# Altium footprint library PCB1.PcbLib: 98 footprints (part 3 of 7)
Each footprint in its own frame and in the unit in brackets; x right, y up, seen from the top. Pads: shape width x height; smd on the part's side, far side on the other; paste and mask are expansions set on the pad; w line width, h text height; cw(c..) or ccw(c..) is an arc to the next point about the centre after c.
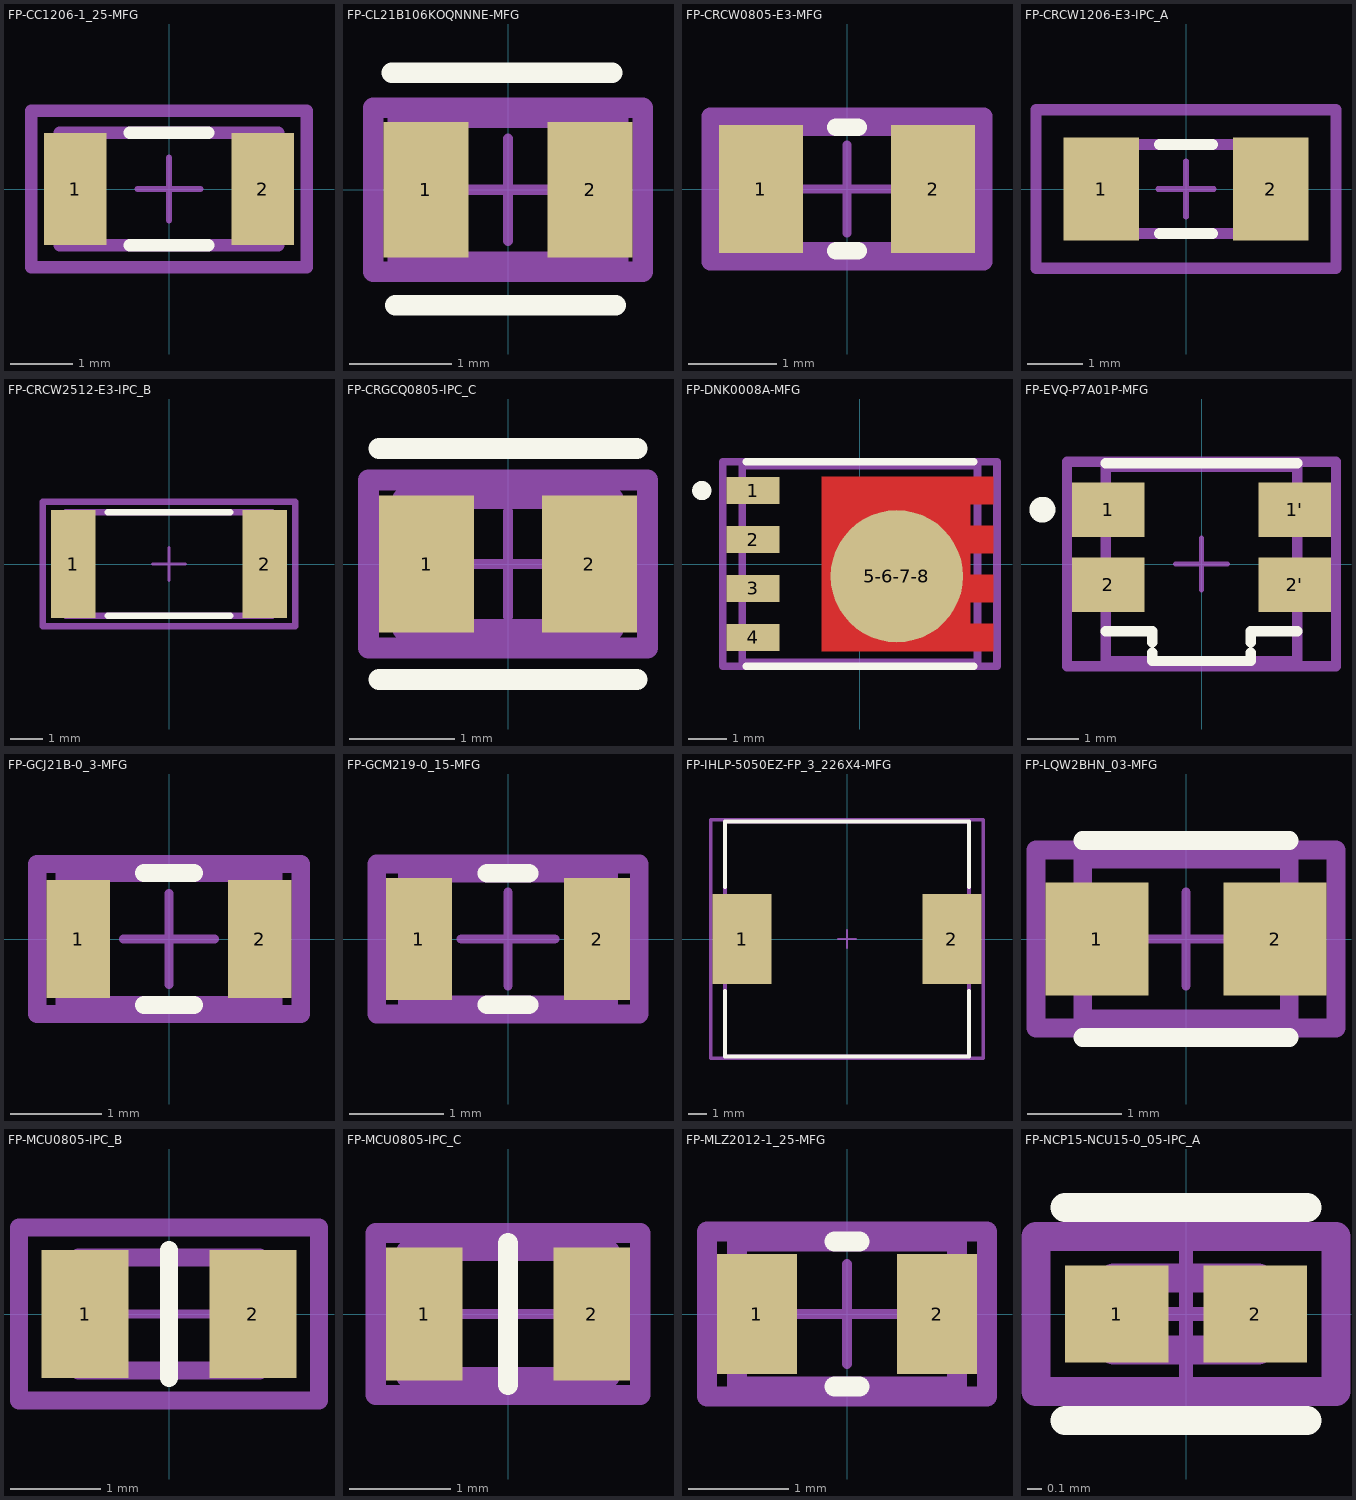
[diagram p2: the footprints below, top view; thin cyan lines are the x and y axes]

## FP-CC1206-1_25-MFG [mm]
pads (2):
  rect 1x1.8 smd paste+0 mask+0: 1(-1.5,0) 2(1.5,0)
Top Overlay:
  lines w0.2: -0.625,-0.9 0.625,-0.9 ; -0.625,0.9 0.625,0.9
Top Assembly:
  lines w0.2: -2.2,-1.25 -2.2,1.25 2.2,1.25 2.2,-1.25 -2.2,-1.25
Top 3D Body:
  lines w0.2: -1.75,-0.9 -1.75,0.9 1.75,0.9 1.75,-0.9 -1.75,-0.9
Top Courtyard:
  lines w0.2: -2.2,-1.25 -2.2,1.25 2.2,1.25 2.2,-1.25 -2.2,-1.25
Top Component Center:
  lines w0.1: -0.5,0 0.5,0 ; 0,-0.5 0,0.5
3D body "Cap_Yageo_CC1206KKX7R8BB105_eec.STEP": height 0.25, standoff 0, extent -2.2,-1.25 2.2,1.25

## FP-CL21B106KOQNNNE-MFG [mm]
pads (2):
  rect 0.825x1.325 smd paste+0 mask+0: 1(-0.8,0) 2(0.8,0)
Top Overlay:
  lines w0.2: -1.133,1.14 1.017,1.14 ; -1.1,-1.125 1.05,-1.125
Top Assembly:
  lines w0.2: -1.312,-0.8 1.312,-0.8 1.312,0.8 -1.312,0.8 -1.312,-0.8
Top 3D Body:
  lines w0.2: -1.075,-0.7 1.075,-0.7 1.075,0.7 -1.075,0.7 -1.075,-0.7
Top Courtyard:
  lines w0.2: -1.312,-0.8 1.312,-0.8 1.312,0.8 -1.312,0.8 -1.312,-0.8
Top Component Center:
  lines w0.1: -0.5,0 0.5,0 ; 0,-0.5 0,0.5
3D body "Cap_Samsung_Electro-Mechanics_America_Inc_CL21B106KOQNNNE_eec.STEP": height 3.3, standoff 1.9, extent -1.011,-0.632 0.989,0.618

## FP-CRCW0805-E3-MFG [mm]
pads (2):
  rect 0.95x1.45 smd paste+0 mask+0: 1(-0.975,0) 2(0.975,0)
Top Overlay:
  lines w0.2: -0.125,-0.7 0.125,-0.7 ; -0.125,0.7 0.125,0.7
Top Assembly:
  lines w0.2: -1.55,-0.825 1.55,-0.825 1.55,0.825 -1.55,0.825 -1.55,-0.825
Top 3D Body:
  lines w0.2: -1.1,-0.7 1.1,-0.7 1.1,0.7 -1.1,0.7 -1.1,-0.7
Top Courtyard:
  lines w0.2: -1.55,-0.825 1.55,-0.825 1.55,0.825 -1.55,0.825 -1.55,-0.825
Top Component Center:
  lines w0.1: -0.5,0 0.5,0 ; 0,-0.5 0,0.5
3D body "Res_Vishay_CRCW0805100KFKEA_eec.STEP": height 0.5, standoff 0, extent -1,-0.625 1,0.625

## FP-CRCW1206-E3-IPC_A [mm]
pads (2):
  rect 1.356x1.858 smd paste+0 mask+0: 1(-1.526,0) 2(1.526,0)
Top Overlay:
  lines w0.2: -0.473,-0.8 0.473,-0.8 ; -0.473,0.8 0.473,0.8
Top Assembly:
  lines w0.2: -2.704,-1.429 2.704,-1.429 2.704,1.429 -2.704,1.429 -2.704,-1.429
Top 3D Body:
  lines w0.2: -1.6,-0.8 1.6,-0.8 1.6,0.8 -1.6,0.8 -1.6,-0.8
Top Courtyard:
  lines w0.2: -2.704,-1.429 2.704,-1.429 2.704,1.429 -2.704,1.429 -2.704,-1.429
Top Component Center:
  lines w0.1: -0.5,0 0.5,0 ; 0,-0.5 0,0.5
3D body "Res_Vishay_CRCW1206619RFKEB_eec.STEP": height 0.25, standoff 0, extent -2.704,-1.429 2.704,1.429

## FP-CRCW2512-E3-IPC_B [mm]
pads (2):
  rect 1.355x3.308 smd paste+0 mask+0: 1(-2.926,0) 2(2.926,0)
Top Overlay:
  lines w0.2: -1.873,-1.575 1.873,-1.575 ; -1.873,1.575 1.873,1.575
Top Assembly:
  lines w0.2: -3.853,-1.904 3.853,-1.904 3.853,1.904 -3.853,1.904 -3.853,-1.904
Top 3D Body:
  lines w0.2: -3.15,-1.575 3.15,-1.575 3.15,1.575 -3.15,1.575 -3.15,-1.575
Top Courtyard:
  lines w0.2: -3.853,-1.904 3.853,-1.904 3.853,1.904 -3.853,1.904 -3.853,-1.904
Top Component Center:
  lines w0.1: -0.5,0 0.5,0 ; 0,-0.5 0,0.5
3D body "Res_Vishay_CRCW25121K80FKEG_eec.STEP": height 0.25, standoff 0, extent -3.853,-1.904 3.853,1.904

## FP-CRGCQ0805-IPC_C [mm]
pads (2):
  rect 0.906x1.31 smd paste+0 mask+0: 1(-0.776,0) 2(0.776,0)
Top Overlay:
  lines w0.2: -1.229,-1.1 1.229,-1.1 ; -1.229,1.1 1.229,1.1
Top Assembly:
  lines w0.2: -1.329,-0.8 -1.329,0.8 1.329,0.8 1.329,-0.8 -1.329,-0.8
Top 3D Body:
  lines w0.2: -1,-0.625 -1,0.625 1,0.625 1,-0.625 -1,-0.625
Top Courtyard:
  lines w0.2: -1.329,-0.8 -1.329,0.8 1.329,0.8 1.329,-0.8 -1.329,-0.8
Top Component Center:
  lines w0.1: -0.5,0 0.5,0 ; 0,-0.5 0,0.5
3D body "Res_TE_Connectivity_CRGCQ0805F180R_eec.STEP": height 0.25, standoff 0, extent -1.329,-0.8 1.329,0.8

## FP-DNK0008A-MFG [mm]
pads (5):
  rect 1.372x0.71 smd paste-1000 mask+0: 1(-2.77,1.905) 2(-2.77,0.635) 3(-2.77,-0.635) 4(-2.77,-1.905)
  round 3.434 smd paste-1000 mask+0: 5-6-7-8(0.958,-0.318)
Top Layer:
  region: -0.984,-2.26 3.456,-2.26 3.456,-1.55 2.866,-1.55 2.866,-0.99 3.456,-0.99 3.456,-0.28 2.866,-0.28 2.866,0.28 3.456,0.28 3.456,0.99 2.866,0.99 2.866,1.55 3.456,1.55 3.456,2.26 -0.984,2.26
Top Overlay:
  circle w0.25: c-4.1,1.905 r0.125
  lines w0.2: -2.95,-2.65 2.95,-2.65 ; -2.95,2.65 2.95,2.65
Top Paste:
  rectangle: -0.697,-1.942 0.597,-1.196
  rectangle: -0.697,-0.896 0.597,-0.15
  rectangle: -0.697,0.15 0.597,0.896
  rectangle: -0.697,1.196 0.597,1.942
  rectangle: 0.947,-1.942 2.241,-1.196
  rectangle: 0.947,-0.896 2.241,-0.15
  rectangle: 0.947,0.15 2.241,0.896
  rectangle: 0.947,1.196 2.241,1.942
  rectangle: 2.527,-2.159 3.293,-1.651
  rectangle: 2.527,-0.889 3.293,-0.381
  rectangle: 2.527,0.381 3.293,0.889
  rectangle: 2.527,1.651 3.293,2.159
  rectangle: -3.293,-2.186 -2.221,-1.624
  rectangle: -3.293,-0.916 -2.221,-0.354
  rectangle: -3.293,0.354 -2.221,0.916
  rectangle: -3.293,1.624 -2.221,2.186
Top Assembly:
  lines w0.2: -3.556,-2.65 -3.556,2.65 3.556,2.65 3.556,-2.65 -3.556,-2.65
Top 3D Body:
  lines w0.2: -3.05,-2.55 -3.05,2.55 3.05,2.55 3.05,-2.55 -3.05,-2.55
Top Courtyard:
  lines w0.2: -3.556,-2.65 -3.556,2.65 3.556,2.65 3.556,-2.65 -3.556,-2.65
Top Component Center:
  lines w0.1: -0.5,0 0.5,0 ; 0,-0.5 0,0.5
3D body "Trans_Texas_Instruments_CSD19532Q5B_eec.STEP": height 0.25, standoff 0, extent -3.556,-2.65 3.556,2.65

## FP-EVQ-P7A01P-MFG [mm]
pads (4):
  rect 1.4x1.05 smd paste+0 mask+0: 1(-1.8,1.05) 1'(1.8,1.05) 2(-1.8,-0.4) 2'(1.8,-0.4)
Top Overlay:
  circle w0.25: c-3.075,1.05 r0.125
  lines w0.2: -1.85,-1.3 -0.95,-1.3 -0.95,-1.517 ; -1.85,1.95 1.85,1.95 ; -0.95,-1.717 -0.95,-1.875 0.95,-1.875 0.95,-1.717 ; 0.95,-1.517 0.95,-1.3 1.85,-1.3
Top Assembly:
  lines w0.2: -2.6,-1.975 -2.6,1.975 2.6,1.975 2.6,-1.975 -2.6,-1.975
Top 3D Body:
  lines w0.2: -1.85,-1.875 -1.85,1.875 1.85,1.875 1.85,-1.875 -1.85,-1.875
Top Courtyard:
  lines w0.2: -2.6,-1.975 -2.6,1.975 2.6,1.975 2.6,-1.975 -2.6,-1.975
Top Component Center:
  lines w0.1: -0.5,0 0.5,0 ; 0,-0.5 0,0.5
3D body "Switch_Panasonic_EVQ-P7A01P_eec.STEP": height 0.25, standoff 0, extent -2.6,-1.975 2.6,1.975

## FP-GCJ21B-0_3-MFG [mm]
pads (2):
  rect 0.7x1.3 smd paste+0 mask+0: 1(-1,0) 2(1,0)
Top Overlay:
  lines w0.2: -0.275,-0.725 0.275,-0.725 ; -0.275,0.725 0.275,0.725
Top Assembly:
  lines w0.2: -1.45,-0.825 -1.45,0.825 1.45,0.825 1.45,-0.825 -1.45,-0.825
Top 3D Body:
  lines w0.2: -1.15,-0.725 -1.15,0.725 1.15,0.725 1.15,-0.725 -1.15,-0.725
Top Courtyard:
  lines w0.2: -1.45,-0.825 -1.45,0.825 1.45,0.825 1.45,-0.825 -1.45,-0.825
Top Component Center:
  lines w0.1: -0.5,0 0.5,0 ; 0,-0.5 0,0.5
3D body "Cap_Murata_GCJ21BR71H105KA01K_eec.STEP": height 0.25, standoff 0, extent -1.45,-0.825 1.45,0.825

## FP-GCM219-0_15-MFG [mm]
pads (2):
  rect 0.7x1.3 smd paste+0 mask+0: 1(-0.95,0) 2(0.95,0)
Top Overlay:
  lines w0.2: -0.225,-0.7 0.225,-0.7 ; -0.225,0.7 0.225,0.7
Top Assembly:
  lines w0.2: -1.4,-0.8 1.4,-0.8 1.4,0.8 -1.4,0.8 -1.4,-0.8
Top 3D Body:
  lines w0.2: -1.075,-0.7 1.075,-0.7 1.075,0.7 -1.075,0.7 -1.075,-0.7
Top Courtyard:
  lines w0.2: -1.4,-0.8 1.4,-0.8 1.4,0.8 -1.4,0.8 -1.4,-0.8
Top Component Center:
  lines w0.1: -0.5,0 0.5,0 ; 0,-0.5 0,0.5
3D body "Cap_Murata_GCM2199E2A152KA05D_eec.STEP": height 0.25, standoff 0, extent -1.4,-0.8 1.4,0.8

## FP-IHLP-5050EZ-FP_3_226X4-MFG [mil]
pads (2):
  rect 127.01x195 smd paste+0 mask+0: 1(-226.5,0) 2(226.5,0)
Top Overlay:
  lines w7.87: -263.5,-112.26 -263.5,-253.94 263.5,-253.94 263.5,-112.26 ; -263.5,112.26 -263.5,253.94 263.5,253.94 263.5,112.26
Top Assembly:
  lines w7.87: -293.94,-257.87 -293.94,257.87 293.94,257.87 293.94,-257.87 -293.94,-257.87
Top 3D Body:
  lines w7.87: -263.5,-253.94 -263.5,253.94 263.5,253.94 263.5,-253.94 -263.5,-253.94
Top Courtyard:
  lines w7.87: -293.94,-257.87 -293.94,257.87 293.94,257.87 293.94,-257.87 -293.94,-257.87
Top Component Center:
  lines w3.94: -19.68,0 19.68,0 ; 0,-19.68 0,19.68
3D body "Ind_Vishay_IHLP5050EZER5R6M5A_eec.STEP": height 10, standoff 0, extent -293.94,-257.87 293.94,257.87

## FP-LQW2BHN_03-MFG [mm]
pads (2):
  rect 1.1x1.2 smd paste+0 mask+0: 1(-0.95,0) 2(0.95,0)
Top Overlay:
  lines w0.2: -1.1,-1.05 1.1,-1.05 ; -1.1,1.05 1.1,1.05
Top Assembly:
  lines w0.2: -1.6,-0.95 1.6,-0.95 1.6,0.95 -1.6,0.95 -1.6,-0.95
Top 3D Body:
  lines w0.2: -1.1,-0.85 1.1,-0.85 1.1,0.85 -1.1,0.85 -1.1,-0.85
Top Courtyard:
  lines w0.2: -1.6,-0.95 1.6,-0.95 1.6,0.95 -1.6,0.95 -1.6,-0.95
Top Component Center:
  lines w0.1: -0.5,0 0.5,0 ; 0,-0.5 0,0.5
3D body "Ind_Murata_LQW2BHN10NJ03K_eec.STEP": height 0.25, standoff 0, extent -1.6,-0.95 1.6,0.95

## FP-MCU0805-IPC_B [mm]
pads (2):
  rect 0.959x1.408 smd paste+0 mask+0: 1(-0.927,0) 2(0.927,0)
Top Overlay:
  lines w0.2: 0,-0.704 0,0.704
Top Assembly:
  lines w0.2: -1.656,-0.954 1.656,-0.954 1.656,0.954 -1.656,0.954 -1.656,-0.954
Top 3D Body:
  lines w0.2: -1,-0.625 1,-0.625 1,0.625 -1,0.625 -1,-0.625
Top Courtyard:
  lines w0.2: -1.656,-0.954 1.656,-0.954 1.656,0.954 -1.656,0.954 -1.656,-0.954
Top Component Center:
  lines w0.1: -0.5,0 0.5,0 ; 0,-0.5 0,0.5
3D body "Res_Vishay_MCU08050D2210BP100_eec.STEP": height 0.25, standoff 0, extent -1.656,-0.954 1.656,0.954

## FP-MCU0805-IPC_C [mm]
pads (2):
  rect 0.759x1.308 smd paste+0 mask+0: 1(-0.827,0) 2(0.827,0)
Top Overlay:
  lines w0.2: 0,-0.7 0,0.7
Top Assembly:
  lines w0.2: -1.306,-0.8 1.306,-0.8 1.306,0.8 -1.306,0.8 -1.306,-0.8
Top 3D Body:
  lines w0.2: -1,-0.625 1,-0.625 1,0.625 -1,0.625 -1,-0.625
Top Courtyard:
  lines w0.2: -1.306,-0.8 1.306,-0.8 1.306,0.8 -1.306,0.8 -1.306,-0.8
Top Component Center:
  lines w0.1: -0.5,0 0.5,0 ; 0,-0.5 0,0.5
3D body "Res_Vishay_MCU08050D2210BP100_eec.STEP": height 0.25, standoff 0, extent -1.306,-0.8 1.306,0.8

## FP-MLZ2012-1_25-MFG [mm]
pads (2):
  rect 0.8x1.2 smd paste+0 mask+0: 1(-0.9,0) 2(0.9,0)
Top Overlay:
  lines w0.2: -0.125,-0.725 0.125,-0.725 ; -0.125,0.725 0.125,0.725
Top Assembly:
  lines w0.2: -1.4,-0.825 1.4,-0.825 1.4,0.825 -1.4,0.825 -1.4,-0.825
Top 3D Body:
  lines w0.2: -1.1,-0.725 1.1,-0.725 1.1,0.725 -1.1,0.725 -1.1,-0.725
Top Courtyard:
  lines w0.2: -1.4,-0.825 1.4,-0.825 1.4,0.825 -1.4,0.825 -1.4,-0.825
Top Component Center:
  lines w0.1: -0.5,0 0.5,0 ; 0,-0.5 0,0.5
3D body "Ind_TDK_MLZ2012N100LTD25_eec.STEP": height 0.25, standoff 0, extent -1.4,-0.825 1.4,0.825

## FP-NCP15-NCU15-0_05-IPC_A [mm]
pads (2):
  rect 0.715x0.672 smd paste+0 mask+0: 1(-0.479,0) 2(0.479,0)
Top Overlay:
  lines w0.2: -0.836,-0.736 0.836,-0.736 ; -0.836,0.736 0.836,0.736
Top Assembly:
  lines w0.2: -1.036,-0.536 -1.036,0.536 1.036,0.536 1.036,-0.536 -1.036,-0.536
Top 3D Body:
  lines w0.2: -0.5,-0.25 -0.5,0.25 0.5,0.25 0.5,-0.25 -0.5,-0.25
Top Courtyard:
  lines w0.2: -1.036,-0.536 -1.036,0.536 1.036,0.536 1.036,-0.536 -1.036,-0.536
Top Component Center:
  lines w0.1: -0.5,0 0.5,0 ; 0,-0.5 0,0.5
3D body "Res_Murata_NCP15WF104F03RC_eec.STEP": height 0.25, standoff 0, extent -1.036,-0.536 1.036,0.536